# Altium footprint library ssmaster_1.PcbLib: 27 footprints (part 2 of 2)
Each footprint in its own frame and in the unit in brackets; x right, y up, seen from the top. Pads: shape width x height; smd on the part's side, far side on the other; paste and mask are expansions set on the pad; w line width, h text height; cw(c..) or ccw(c..) is an arc to the next point about the centre after c.
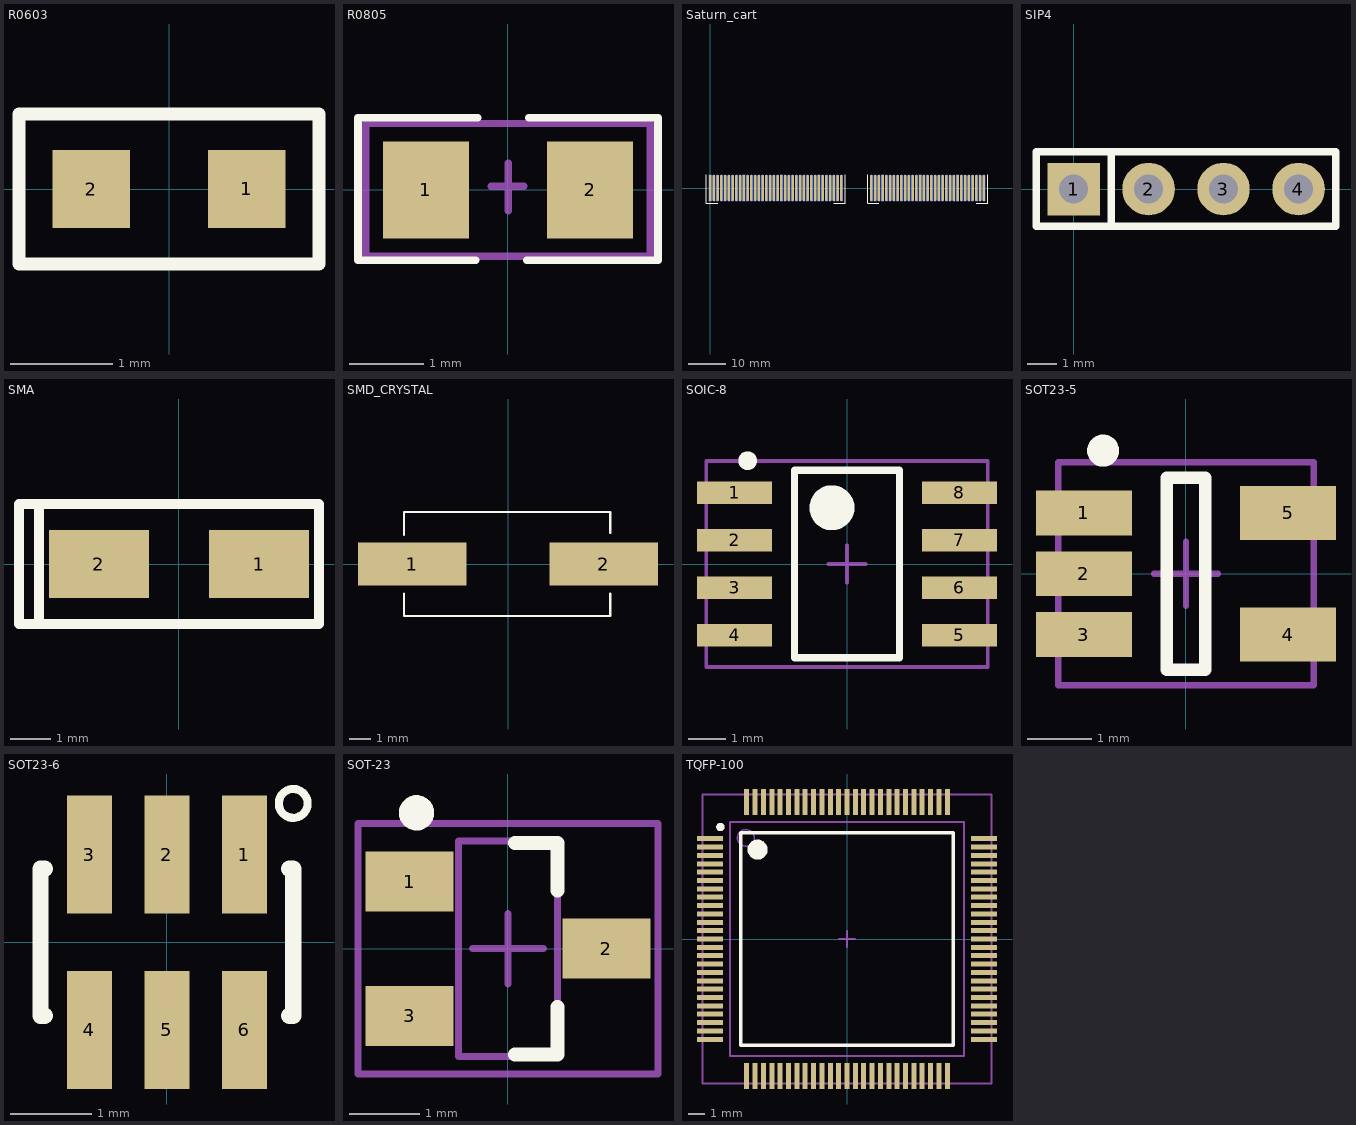
[diagram p1: the footprints below, top view; thin cyan lines are the x and y axes]

## R0603 [mil]
height 35.04
pads (2):
  rect 30x30 smd: 1(30,0) 2(-30,0)
Top Overlay:
  lines w5: -58,-29 58,-29 58,29 -58,29 -58,-29
3D body: height 35.93, standoff 0.5, extent -31.99,-16 31,15.89

## R0805 [mm]
height 0.5
pads (2):
  rect 1.15x1.3 smd: 1(-1.1,0) 2(1.1,0)
Top Overlay:
  lines w0.102: -0.432,-0.94 -2.007,-0.94 -2.007,0.965 -0.406,0.965 ; 0.254,-0.94 2.007,-0.94 2.007,0.965 0.279,0.965
Mechanical 15:
  lines w0.1: -0.222,0.051 0.006,0.051 ; 0.006,-0.279 0.006,0.356 ; 0.006,0.025 0.006,0.051 ; 0.21,0.051 0.006,0.051 ; -1.905,-0.889 -1.905,0.889 1.905,0.889 1.905,-0.889 -1.905,-0.889
3D body: height 0.5, standoff -0.01, extent -1,-0.61 1,0.6

## Saturn_cart [mm]
pads (134):
  rect 0.7x7 smd far side: A1(0,0) A10(9,0) A20(19,0) A30(29,0) A40(46,0) A50(56,0) A60(66,0)
  oval 0.7x7 smd far side: A2(1,0) A3(2,0) A4(3,0) A5(4,0) A6(5,0) A7(6,0) A8(7,0) A9(8,0) A11(10,0) A12(11,0) A13(12,0) A14(13,0) A15(14,0) A16(15,0) A17(16,0) A18(17,0) A19(18,0) A21(20,0) A22(21,0) A23(22,0) A24(23,0) A25(24,0) A26(25,0) A27(26,0) A28(27,0) A29(28,0) A31(30,0) A32(31,0) A33(32,0) A34(33,0) A35(34,0) A36(35,0) A37(43,0) A38(44,0) A39(45,0) A41(47,0) A42(48,0) A43(49,0) A44(50,0) A45(51,0) A46(52,0) A47(53,0) A48(54,0) A49(55,0) A51(57,0) A52(58,0) A53(59,0) A54(60,0) A55(61,0) A56(62,0) A57(63,0) A58(64,0) A59(65,0) A61(67,0) A62(68,0) A63(69,0) A64(70,0) A65(71,0) A66(72,0) A67(73,0)
  rect 0.7x7 smd: B1(0,0) B10(9,0) B20(19,0) B30(29,0) B40(46,0) B50(56,0) B60(66,0)
  oval 0.7x7 smd: B2(1,0) B3(2,0) B4(3,0) B5(4,0) B6(5,0) B7(6,0) B8(7,0) B9(8,0) B11(10,0) B12(11,0) B13(12,0) B14(13,0) B15(14,0) B16(15,0) B17(16,0) B18(17,0) B19(18,0) B21(20,0) B22(21,0) B23(22,0) B24(23,0) B25(24,0) B26(25,0) B27(26,0) B28(27,0) B29(28,0) B31(30,0) B32(31,0) B33(32,0) B34(33,0) B35(34,0) B36(35,0) B37(43,0) B38(44,0) B39(45,0) B41(47,0) B42(48,0) B43(49,0) B44(50,0) B45(51,0) B46(52,0) B47(53,0) B48(54,0) B49(55,0) B51(57,0) B52(58,0) B53(59,0) B54(60,0) B55(61,0) B56(62,0) B57(63,0) B58(64,0) B59(65,0) B61(67,0) B62(68,0) B63(69,0) B64(70,0) B65(71,0) B66(72,0) B67(73,0)
Top Overlay:
  lines w0.254: -1,3.5 -1,-4 2,-4 ; 33,-4 36,-4 36,3.5 ; 42,3.5 42,-4 45,-4 ; 71,-4 74,-4 74,3.5

## SIP4 [mil]
pads (4):
  rect 70x70 hole 39: 1(0,0)
  round 70 hole 39: 2(100,0) 3(200,0) 4(300,0)
Top Overlay:
  lines w10: 50,-50 50,50 ; -50,-50 350,-50 350,50 -50,50 -50,-50

## SMA [mm]
pads (2):
  rect 2.5x1.7 smd: 1(2,0) 2(-2,0)
Top Overlay:
  lines w0.254: -3.5,-1.5 3.5,-1.5 3.5,1.5 -3.5,1.5 ; -3.5,-1.5 -3.5,1.5 ; -3.5,-1.5 -4,-1.5 -4,1.5 -3.5,1.5

## SMD_CRYSTAL [mm]
pads (2):
  rect 5x2 smd: 1(-4.407,0) 2(4.407,0)
Top Overlay:
  lines w0.1: -4.788,-1.372 -4.788,-2.4 4.712,-2.4 4.712,-1.372 ; -4.788,1.346 -4.788,2.4 4.712,2.4 4.712,1.422
3D body: height 4, standoff 0, extent -6.751,-2.462 6.649,2.438

## SOIC-8 [mm]
height 1.4
pads (8):
  rect 2x0.6 smd: 1(-3,1.905) 2(-3,0.635) 3(-3,-0.635) 4(-3,-1.905) 5(3,-1.905) 6(3,-0.635) 7(3,0.635) 8(3,1.905)
Top Overlay:
  circle w0.6: c-0.4,1.5 r0.3
  circle w0.25: c-2.65,2.755 r0.125
  lines w0.2: -1.4,-2.5 1.4,-2.5 1.4,2.5 -1.4,2.5 -1.4,-2.5
Mechanical 15:
  lines w0.1: -0.5,0 0.5,0 ; 0,-0.5 0,0.5 ; -3.75,-2.75 3.75,-2.75 3.75,2.75 -3.75,2.75 -3.75,-2.75
3D body: height 1.51, standoff 0, extent -3.05,-2.438 3.05,2.462

## SOT23-5 [mm]
pads (5):
  rect 1.5x0.7 smd: 1(-1.595,0.95) 2(-1.595,0) 3(-1.595,-0.95)
  rect 1.5x0.85 smd: 4(1.595,-0.95) 5(1.595,0.95)
Top Overlay:
  circle w0.25: c-1.295,1.925 r0.125
  lines w0.2: -0.3,-1.5 -0.3,1.5 0.3,1.5 0.3,-1.5 -0.3,-1.5
Mechanical 15:
  lines w0.1: -0.5,0 0.5,0 ; 0,-0.5 0,0.5 ; -2,-1.745 2,-1.745 2,1.745 -2,1.745 -2,-1.745
3D body: height 1.09, standoff -0.01, extent -1.395,-1.46 1.406,1.44

## SOT23-6 [mm]
pads (6):
  rect 0.55x1.45 smd: 1(0.95,1.075) 2(0,1.075) 3(-0.95,1.075) 4(-0.95,-1.075) 5(0,-1.075) 6(0.95,-1.075)
Top Overlay:
  circle w0.1: c1.549,1.702 r0.177
  lines w0.2: -1.5,-0.9 -1.55,-0.9 -1.55,0.9 -1.5,0.9 ; 1.5,-0.9 1.55,-0.9 1.55,0.9 1.5,0.9
3D body: height 1.08, standoff -0.01, extent -1.397,-1.194 1.397,1.232

## SOT-23 [mm]
pads (3):
  rect 1.25x0.85 smd: 1(-1.395,0.95) 2(1.395,0) 3(-1.395,-0.95)
Top Overlay:
  circle w0.25: c-1.295,1.925 r0.125
  lines w0.2: 0.1,-1.5 0.7,-1.5 0.7,-0.825 ; 0.1,1.5 0.7,1.5 0.7,0.825
Mechanical 13:
  lines w0.1: -0.7,-1.525 -0.7,1.525 0.7,1.525 0.7,-1.525 -0.7,-1.525
Mechanical 15:
  lines w0.1: -0.5,0 0.5,0 ; 0,-0.5 0,0.5 ; -2.125,-1.775 -2.125,1.775 2.125,1.775 2.125,-1.775 -2.125,-1.775
3D body: height 1.04, standoff -0.03, extent -1.124,-1.473 1.174,1.447

## TQFP-100 [mm]
height 1.6
pads (100):
  rect 1.55x0.3 smd: 1(-8.2,6) 2(-8.2,5.5) 3(-8.2,5) 4(-8.2,4.5) 5(-8.2,4) 6(-8.2,3.5) 7(-8.2,3) 8(-8.2,2.5) 9(-8.2,2) 10(-8.2,1.5) 11(-8.2,1) 12(-8.2,0.5) 13(-8.2,0) 14(-8.2,-0.5) 15(-8.2,-1) 16(-8.2,-1.5) 17(-8.2,-2) 18(-8.2,-2.5) 19(-8.2,-3) 20(-8.2,-3.5) 21(-8.2,-4) 22(-8.2,-4.5) 23(-8.2,-5) 24(-8.2,-5.5) 25(-8.2,-6) 51(8.2,-6) 52(8.2,-5.5) 53(8.2,-5) 54(8.2,-4.5) 55(8.2,-4) 56(8.2,-3.5) 57(8.2,-3) 58(8.2,-2.5) 59(8.2,-2) 60(8.2,-1.5) 61(8.2,-1) 62(8.2,-0.5) 63(8.2,0) 64(8.2,0.5) 65(8.2,1) 66(8.2,1.5) 67(8.2,2) 68(8.2,2.5) 69(8.2,3) 70(8.2,3.5) 71(8.2,4) 72(8.2,4.5) 73(8.2,5) 74(8.2,5.5) 75(8.2,6)
  rect 0.3x1.55 smd: 26(-6,-8.2) 27(-5.5,-8.2) 28(-5,-8.2) 29(-4.5,-8.2) 30(-4,-8.2) 31(-3.5,-8.2) 32(-3,-8.2) 33(-2.5,-8.2) 34(-2,-8.2) 35(-1.5,-8.2) 36(-1,-8.2) 37(-0.5,-8.2) 38(0,-8.2) 39(0.5,-8.2) 40(1,-8.2) 41(1.5,-8.2) 42(2,-8.2) 43(2.5,-8.2) 44(3,-8.2) 45(3.5,-8.2) 46(4,-8.2) 47(4.5,-8.2) 48(5,-8.2) 49(5.5,-8.2) 50(6,-8.2) 76(6,8.2) 77(5.5,8.2) 78(5,8.2) 79(4.5,8.2) 80(4,8.2) 81(3.5,8.2) 82(3,8.2) 83(2.5,8.2) 84(2,8.2) 85(1.5,8.2) 86(1,8.2) 87(0.5,8.2) 88(0,8.2) 89(-0.5,8.2) 90(-1,8.2) 91(-1.5,8.2) 92(-2,8.2) 93(-2.5,8.2) 94(-3,8.2) 95(-3.5,8.2) 96(-4,8.2) 97(-4.5,8.2) 98(-5,8.2) 99(-5.5,8.2) 100(-6,8.2)
Top Overlay:
  circle w0.6: c-5.35,5.35 r0.3
  circle w0.25: c-7.575,6.7 r0.125
  lines w0.2: -6.35,-6.35 6.35,-6.35 6.35,6.35 -6.35,6.35 -6.35,-6.35
Mechanical 13:
  circle w0.1: c-6.05,6.05 r0.5
  lines w0.1: -7,-7 7,-7 7,7 -7,7 -7,-7
Mechanical 15:
  lines w0.1: -0.5,0 0.5,0 ; 0,-0.5 0,0.5 ; -8.65,-8.65 8.65,-8.65 8.65,8.65 -8.65,8.65 -8.65,-8.65
3D body: height 1.76, standoff 0, extent -8.026,-8.026 8.026,8.02